# Altium footprint library EXPLORER.PcbLib: 252 footprints (part 4 of 16)
Each footprint in its own frame and in the unit in brackets; x right, y up, seen from the top. Pads: shape width x height; smd on the part's side, far side on the other; paste and mask are expansions set on the pad; w line width, h text height; cw(c..) or ccw(c..) is an arc to the next point about the centre after c.
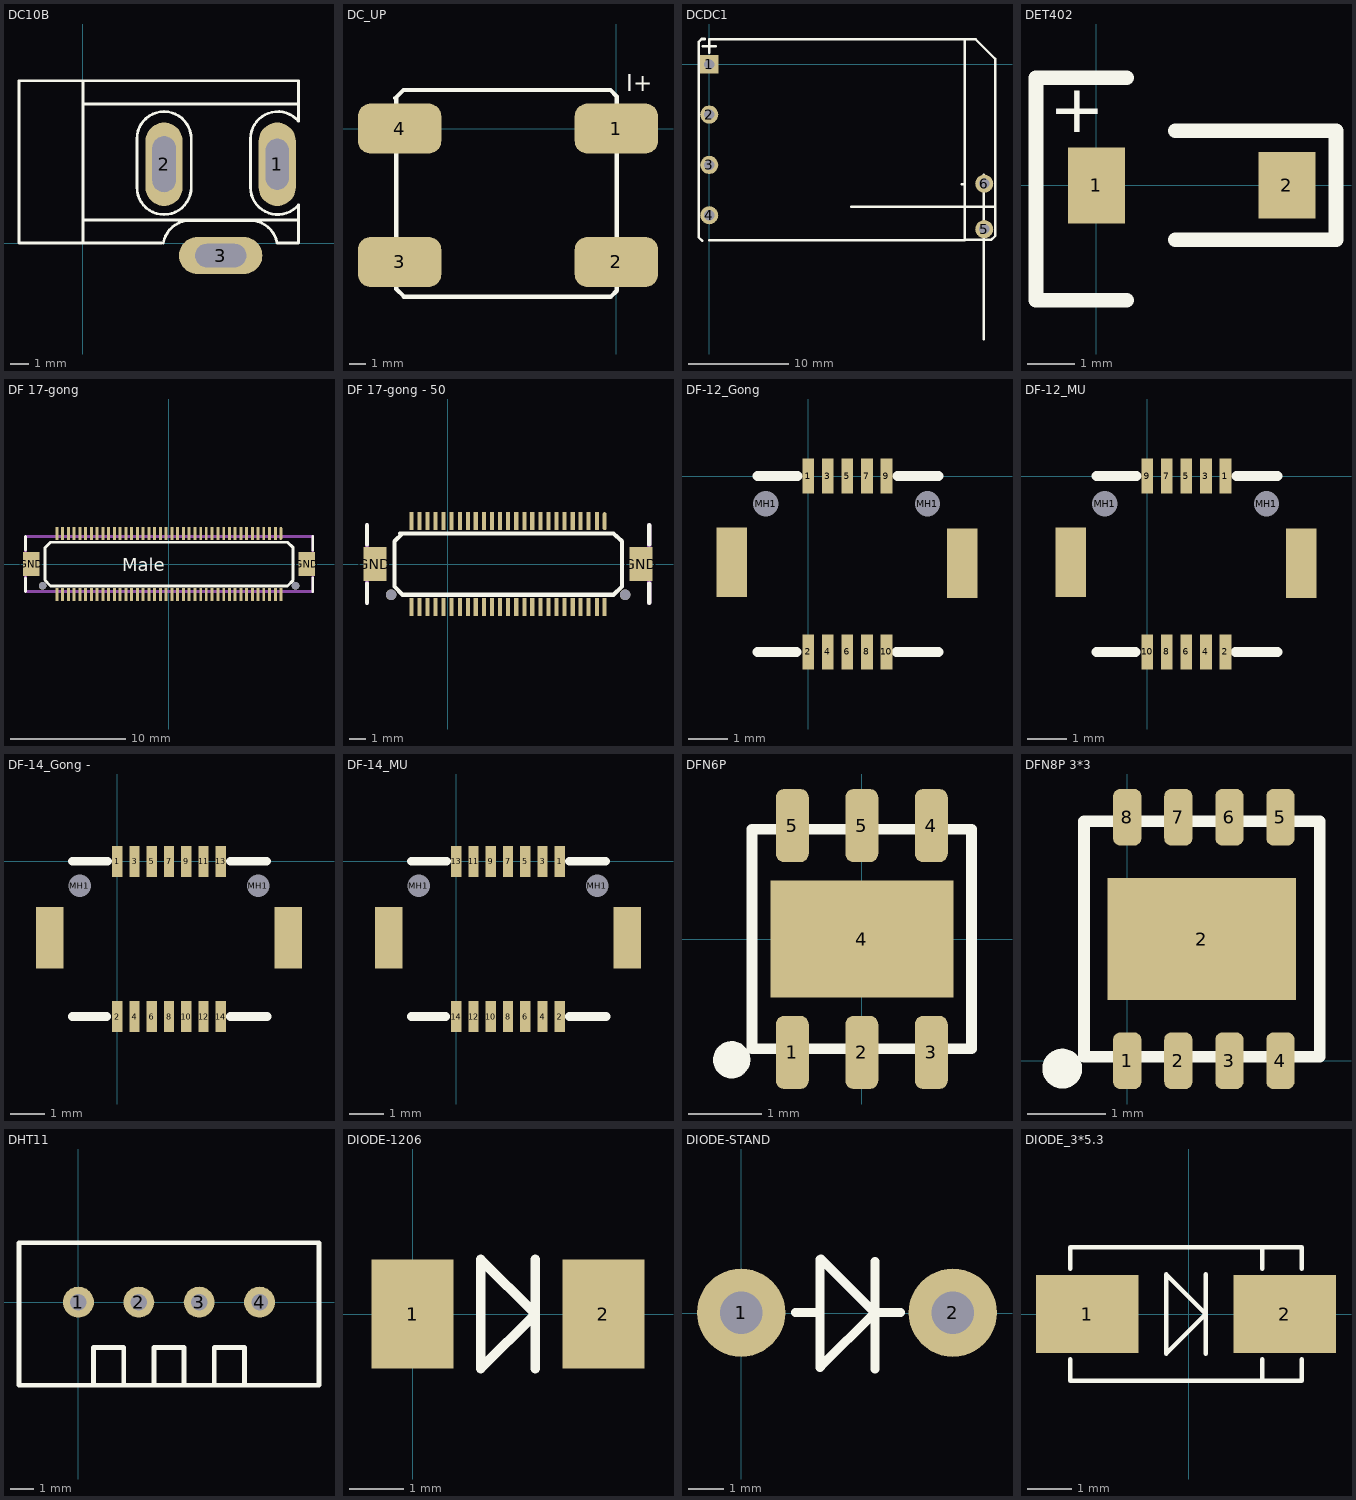
[diagram p3: the footprints below, top view; thin cyan lines are the x and y axes]

## DC10B [mil]
pads (3):
  oval 80x180 hole 50 slot 110 at 90 deg: 1(419.09,170)
  oval 80x180 hole 50 slot 120 at 90 deg: 2(175,170)
  oval 180x80 hole 50 slot 110 at 0 deg: 3(297.05,-26.85)
Top Overlay:
  lines w6: 0,50 465,50 ; 0,300 460.13,300 464.25,300 ; 5,350 -15,350 -137.8,350 -137.8,0 0,0 ; 169,0 0,0 ; 173.37,0.16 cw(c231,-10) 231,48.52 361,48.52 cw(c361,-10) 418.63,0.16 ; 420,0 465,0 465,80 ; 464.83,82.38 cw(c420,120) 361.48,120 361.48,225 cw(c420,225) 464.83,262.62 465,350 0,350 0,0 ; 233.52,225 ccw(c175,225) 116.48,225 116.48,120 ccw(c175,120) 233.52,120 233.52,225 ; 233.52,225 233.52,225

## DC_UP [mm]
pads (4):
  rrect50% 5x3 smd: 1(0,0) 2(0,-8) 3(-13,-8) 4(-13,0)
Top Overlay:
  lines w0.254: -13.259,1.829 -12.776,2.311 -0.356,2.311 0.025,1.93 0.025,-9.728 -0.33,-10.084 -12.751,-10.084 -13.208,-9.627 -13.208,1.854
  text "I+" at 0.61,2.235 h1.02

## DCDC1 [mm]
pads (6):
  rect 1.8x1.8 hole 1: 1(0,0)
  round 1.8 hole 1: 2(0,-5) 3(0,-10) 4(0,-15) 5(27.33,-16.383) 6(27.33,-11.862)
Top Overlay:
  lines w0.254: -0.711,-17.526 -1.041,-17.196 -1.041,2.235 -0.762,2.515 -0.432,2.515 ; -0.635,1.778 0.635,1.778 ; 0,-17.5 25.4,-17.5 25.4,2.5 0,2.5 ; 0,1.143 0,2.413 ; 14.14,-14.14 28.28,-14.14 ; 25.095,-11.913 25.4,-11.913 25.4,2.489 ; 25.248,2.489 26.467,2.489 28.423,0.533 28.423,-17.043 28.016,-17.45 25.4,-17.45 ; 25.4,-17.374 25.4,-14.122 ; 27.3,-27.3 27.3,-10.973

## DET402 [mm]
pads (2):
  rect 1.2x1.6 smd: 1(0,-0.002)
  rect 1.2x1.4 smd: 2(4,0)
Top Overlay:
  lines w0.305: 0.635,-2.413 -1.27,-2.413 -1.27,2.261 0.635,2.261 ; 1.651,-1.145 5.029,-1.145 5.029,1.143 1.651,1.143
  text "+" at -0.991,1.118 h1.02

## DF 17-gong [mil]
pads (84):
  rrect100% 10x44 smd: 1(384,105)
  rect 10x44 smd: 2(384,-104.33) 3(365,105) 4(365,-104.33) 5(345,105) 6(345,-104.33) 7(325,105) 8(325,-104.33) 9(306,105) 10(306,-104.33) 11(286,105) 12(286,-104.33) 13(266,105) 14(266,-104.33) 15(247,105) 16(247,-104.33) 17(227,105) 18(227,-104.33) 19(207,105) 20(207,-104.33) 21(188,105) 22(188,-104.33) 23(168,105) 24(168,-104.33) 25(148,105) 26(148,-104.33) 27(128,105) 28(128,-104.33) 29(109,105) 30(109,-104.33) 31(89,105) 32(89,-104.33) 33(69,105) 34(69,-104.33) 35(50,105) 36(50,-104.33) 37(30,105) 38(30,-104.33) 39(10,105) 40(10,-104.33) 41(-9.84,105) 42(-9.84,-104.33) 43(-29.53,105) 44(-29.53,-104.33) 45(-49.21,105) 46(-49.21,-104.33) 47(-68.9,105) 48(-68.9,-104.33) 49(-88.58,105) 50(-88.58,-104.33) 51(-108.27,105) 52(-108.27,-104.33) 53(-127.95,105) 54(-127.95,-104.33) 55(-147.64,105) 56(-147.64,-104.33) 57(-167.32,105) 58(-167.32,-104.33) 59(-187.01,105) 60(-187.01,-104.33) 61(-206.69,105) 62(-206.69,-104.33) 63(-226.38,105) 64(-226.38,-104.33) 65(-246.06,105) 66(-246.06,-104.33) 67(-265.75,105) 68(-265.75,-104.33) 69(-285.43,105) 70(-285.43,-104.33) 71(-305.12,105) 72(-305.12,-104.33) 73(-324.8,105) 74(-324.8,-104.33) 75(-344.49,105) 76(-344.49,-104.33) 77(-364.17,105) 78(-364.17,-104.33) 79(-383.86,105) 80(-383.86,-104.33)
  rect 56x83 smd: GND(-472.44,0) GND(473,0)
  round 26 hole 26 unplated: hole-1(-433.07,-74.8) hole-2(434,-74.8)
Top Overlay:
  lines w10: -492.13,-94.49 -492.13,-47.24 ; -492.13,48 -492.13,95 ; 493,-94.49 493,-47.24 ; 493,48 493,95 ; -425.2,-55.12 -425.2,56 -405.51,75 406,75 426,56 426,-55.12 406,-74.8 -405.51,-74.8 -425.2,-55.12
  text "Male" at -159.84,-40.16 h77.5
Mechanical 16:
  lines w10: -492.13,-94.49 493,-94.49 493,95 -492.13,95 -492.13,-94.49
3D body: height 123.54, standoff -30.01, extent -492.13,-109.41 492.13,115

## DF 17-gong - 50 [mil]
pads (54):
  rrect100% 10x44 smd: 1(384,105)
  rect 10x44 smd: 2(384,-104.33) 3(365,105) 4(365,-104.33) 5(345,105) 6(345,-104.33) 7(325,105) 8(325,-104.33) 9(306,105) 10(306,-104.33) 11(286,105) 12(286,-104.33) 13(266,105) 14(266,-104.33) 15(247,105) 16(247,-104.33) 17(227,105) 18(227,-104.33) 19(207,105) 20(207,-104.33) 21(188,105) 22(188,-104.33) 23(168,105) 24(168,-104.33) 25(148,105) 26(148,-104.33) 27(128,105) 28(128,-104.33) 29(109,105) 30(109,-104.33) 31(89,105) 32(89,-104.33) 33(69,105) 34(69,-104.33) 35(50,105) 36(50,-104.33) 37(30,105) 38(30,-104.33) 39(10,105) 40(10,-104.33) 41(-9.84,105) 42(-9.84,-104.33) 43(-29.53,105) 44(-29.53,-104.33) 45(-49.21,105) 46(-49.21,-104.33) 47(-68.9,105) 48(-68.9,-104.33) 49(-88.58,105) 50(-88.58,-104.33)
  rect 56x83 smd: GND(-177.44,0) GND(473,0)
  round 26 hole 26 unplated: hole-1(-138.07,-74.8) hole-2(434,-74.8)
Top Overlay:
  lines w10: -197.13,-94.49 -197.13,-47.24 ; -197.13,48 -197.13,95 ; -116,75 406,75 426,56 426,-55.12 406,-74.8 -110,-74.8 ; -110.51,-74.8 -130.2,-55.12 -130.2,56 -110.51,75 ; 493,-94.49 493,-47.24 ; 493,48 493,95
Mechanical 16:
  lines w10: -197.13,-94.49 -197.13,95 ; 493,-94.49 493,95

## DF-12_Gong [mm]
pads (14):
  rect 0.3x0.9 smd: 1(0,0) 2(0,-4.5) 3(0.5,0) 4(0.5,-4.5) 5(1,0) 6(1,-4.5) 7(1.5,0) 8(1.5,-4.5) 9(2,0) 10(2,-4.5)
  round 0.599 hole 0.65 unplated: MH1(-1.092,-0.711) MH1(3.048,-0.711)
  rect 0.787x1.778 smd: ""(-1.956,-2.21) ""(3.937,-2.235)
Top Overlay:
  lines w0.254: -1.295,-4.496 -0.305,-4.496 ; -1.295,0 -0.279,0 ; 2.261,-4.496 3.327,-4.496 ; 2.286,0 3.327,0

## DF-12_MU [mm]
pads (14):
  rect 0.3x0.9 smd: 1(2,0) 2(2,-4.5) 3(1.5,0) 4(1.5,-4.5) 5(1,0) 6(1,-4.5) 7(0.5,0) 8(0.5,-4.5) 9(0,0) 10(0,-4.5)
  round 0.599 hole 0.65 unplated: MH1(-1.092,-0.711) MH1(3.048,-0.711)
  rect 0.787x1.778 smd: ""(-1.956,-2.21) ""(3.937,-2.235)
Top Overlay:
  lines w0.254: -1.295,-4.496 -0.305,-4.496 ; -1.295,0 -0.279,0 ; 2.261,-4.496 3.327,-4.496 ; 2.286,0 3.327,0

## DF-14_Gong - [mm]
pads (18):
  rect 0.3x0.9 smd: 1(0,0) 2(0,-4.5) 3(0.5,0) 4(0.5,-4.5) 5(1,0) 6(1,-4.5) 7(1.5,0) 8(1.5,-4.5) 9(2,0) 10(2,-4.5) 11(2.499,0) 12(2.499,-4.5) 13(2.999,0) 14(2.999,-4.5)
  round 0.599 hole 0.65 unplated: MH1(-1.092,-0.711) MH1(4.089,-0.711)
  rect 0.787x1.778 smd: ""(-1.956,-2.21) ""(4.953,-2.21)
Top Overlay:
  lines w0.254: -1.295,-4.496 -0.305,-4.496 ; -1.295,0 -0.279,0 ; 3.277,-4.496 4.343,-4.496 ; 3.277,0 4.318,0

## DF-14_MU [mm]
pads (18):
  rect 0.3x0.9 smd paste+0: 1(2.999,0)
  rect 0.3x0.9 smd: 2(2.999,-4.5) 3(2.499,0) 4(2.499,-4.5) 5(2,0) 6(2,-4.5) 7(1.5,0) 8(1.5,-4.5) 9(1,0) 10(1,-4.5) 11(0.5,0) 12(0.5,-4.5) 13(0,0) 14(0,-4.5)
  round 0.599 hole 0.65 unplated: MH1(-1.092,-0.711) MH1(4.089,-0.711)
  rect 0.787x1.778 smd: ""(-1.956,-2.21) ""(4.953,-2.21)
Top Overlay:
  lines w0.254: -1.295,-4.496 -0.305,-4.496 ; -1.295,0 -0.279,0 ; 3.277,-4.496 4.343,-4.496 ; 3.277,0 4.318,0

## DFN6P [mm]
pads (7):
  rrect50% 0.45x1 smd: 1(-0.95,-1.55) 2(0,-1.55) 3(0.95,-1.55) 4(0.95,1.55) 5(-0.95,1.55) 5(0,1.55)
  rect 2.5x1.6 smd: 4(0,0)
Top Overlay:
  circle w0.254: c-1.778,-1.651 r0.127
  lines w0.15: -1.5,-1.5 1.5,-1.5 1.5,1.5 -1.5,1.5 -1.5,-1.5

## DFN8P 3*3 [mm]
pads (9):
  rrect50% 0.36x0.72 smd: 1(0,0) 2(0.65,0) 3(1.3,0) 4(1.95,0) 5(1.95,3.1) 6(1.3,3.1) 7(0.65,3.1) 8(0,3.1)
  rect 2.4x1.55 smd: 2(0.95,1.55)
Top Overlay:
  circle w0.254: c-0.828,-0.101 r0.127
  lines w0.15: -0.55,0.05 2.45,0.05 2.45,3.05 -0.55,3.05 -0.55,0.05

## DHT11 [mm]
pads (4):
  round 1.3 hole 0.7: 1(0,0) 2(2.54,0) 3(5.08,0) 4(7.62,0)
Top Overlay:
  lines w0.203: -2.5,-3.5 7.62,-3.5 10.12,-3.5 ; -2.5,-3.46 -2.5,0 -2.5,2.5 7.62,2.5 10.12,2.5 10.12,0 10.12,-3.46 ; 0.635,-3.5 0.635,-1.905 1.905,-1.905 1.905,-3.5 ; 3.175,-3.5 3.175,-1.905 4.445,-1.905 4.445,-3.5 ; 5.715,-3.5 5.715,-1.905 6.985,-1.905 6.985,-3.5

## DIODE-1206 [mm] "玻璃封装二极管"
height 3
pads (2):
  rect 1.5x2 smd: 1(0,0) 2(3.5,0)
Top Overlay:
  lines w0.178: 2.25,-1 2.25,1 ; 1.25,-1 2.25,0 1.25,1 1.25,-1

## DIODE-STAND [mm]
height 8.5
pads (2):
  round 2.5 hole 1.2: 1(-0.008,0.013) 2(5.986,0.013)
Top Overlay:
  lines w0.254: 1.531,0.015 2.216,0.015 1.962,0.015 ; 2.227,-1.537 2.227,0.496 2.227,1.511 ; 2.252,-1.511 3.776,0.013 ; 2.252,1.537 3.776,0.013 ; 3.776,-1.587 3.776,1.461 ; 3.98,0.013 3.776,0.013 ; 4.505,0.013 3.776,0.013

## DIODE_3*5.3 [mm]
pads (2):
  rect 2.3x1.75 smd: 1(-2.286,0) 2(2.159,0)
Top Overlay:
  lines w0.1: -2.667,-1.016 -2.667,-1.5 2.54,-1.5 2.54,-1.016 ; -2.667,1.016 -2.667,1.5 2.54,1.5 2.54,1.016 ; 0.381,-0.889 0.381,0.889 ; 1.651,-1.5 1.651,-1.016 ; 1.651,1.016 1.651,1.5 ; -0.508,-0.889 0.381,0 -0.508,0.889 -0.508,-0.889